# Altium footprint library myLib.PcbLib: 58 footprints (part 3 of 4)
Each footprint in its own frame and in the unit in brackets; x right, y up, seen from the top. Pads: shape width x height; smd on the part's side, far side on the other; paste and mask are expansions set on the pad; w line width, h text height; cw(c..) or ccw(c..) is an arc to the next point about the centre after c.
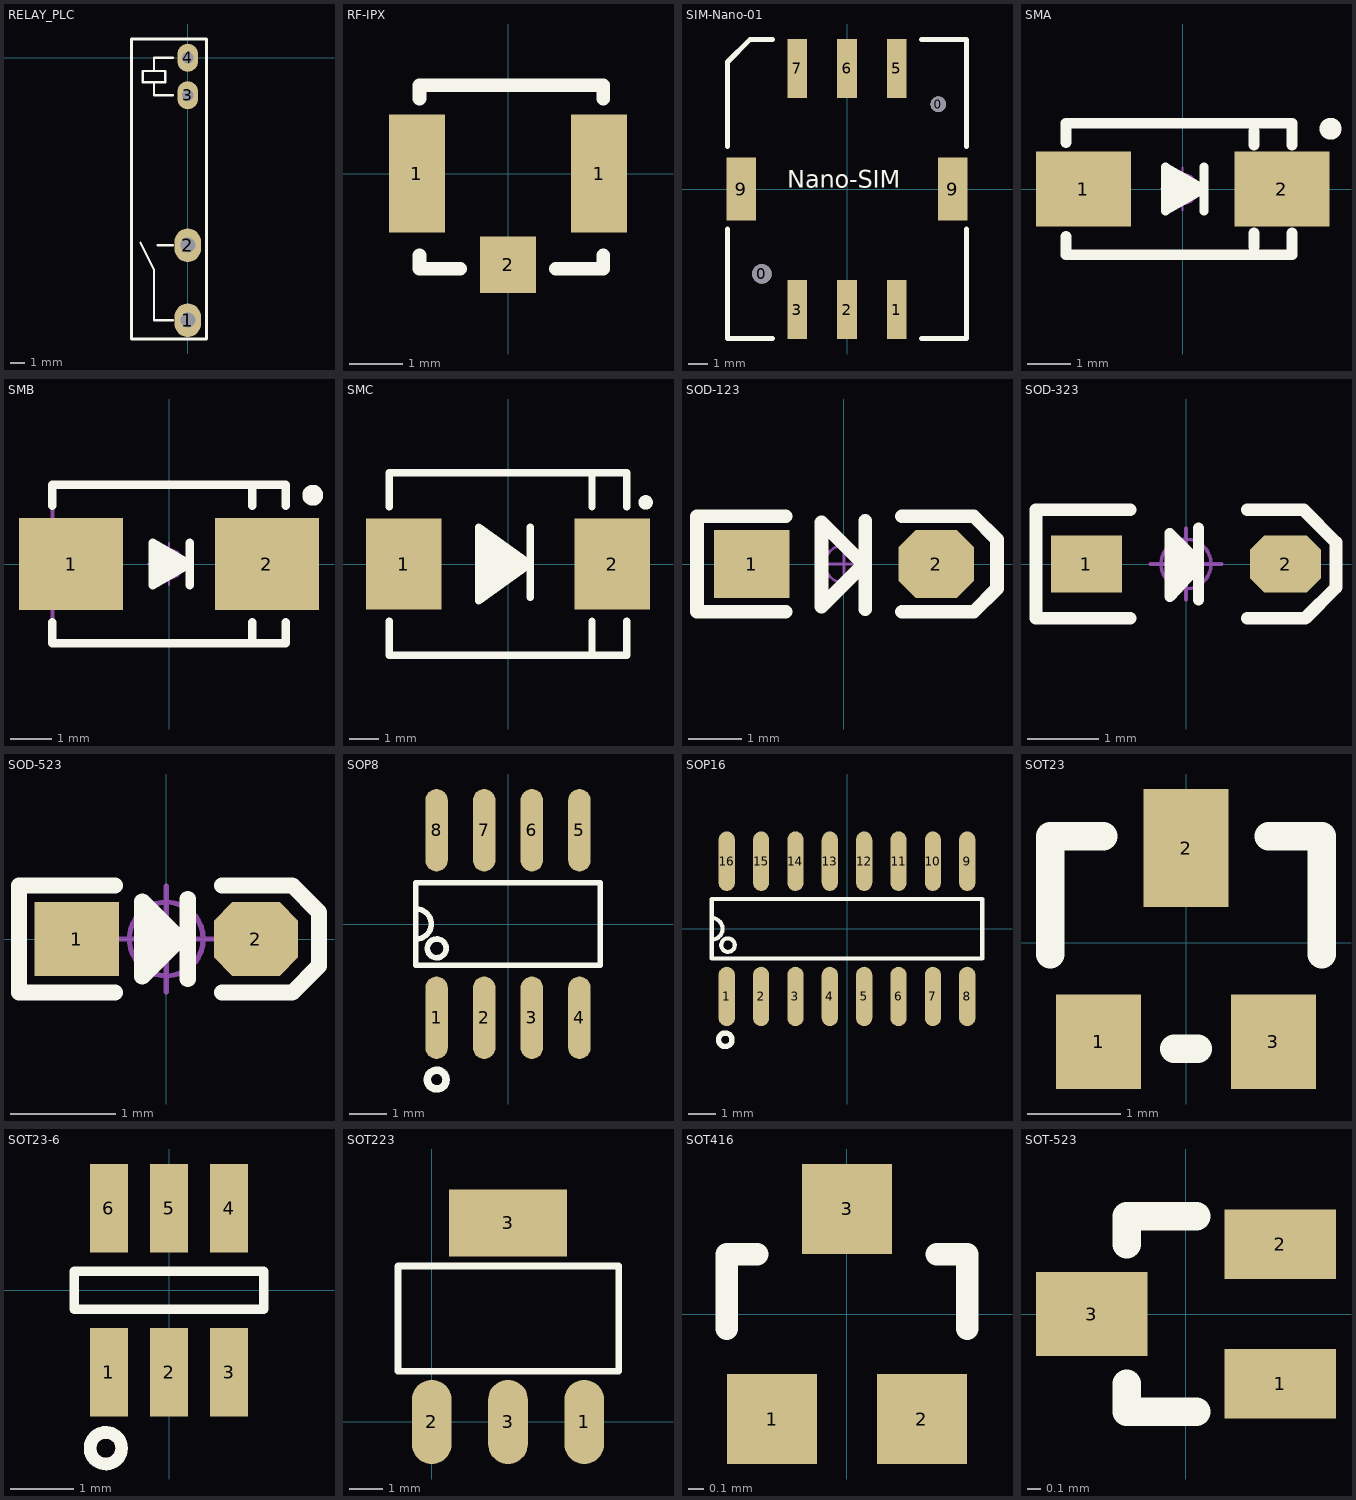
[diagram p2: the footprints below, top view; thin cyan lines are the x and y axes]

## RELAY_PLC [mil]
pads (4):
  oval 70x90 hole 40: 1(0,-700) 2(0,-500)
  oval 55x75 hole 30: 3(0,-100) 4(0,0)
Top Overlay:
  lines w6: -126,-493 -90,-565 -90,-700 -40,-700 ; -90,-65 -90,-100 -40,-100 ; -90,-35 -90,0 -40,0 ; -80,-500 -40,-500 ; -120,-65 -120,-35 -60,-35 -60,-65 -120,-65
  lines w8: -150,-750 50,-750 50,50 -150,50 -150,-750
3D body "RELAY_PLC.STEP": height 492.13, standoff -118.11, extent -148.43,-761.77 48.43,65

## RF-IPX [mm]
pads (3):
  rect 1.05x2.2 smd: 1(-1.7,0) 1(1.7,0)
  rect 1.05x1.05 smd: 2(0,-1.7)
Top Overlay:
  lines w0.254: -1.651,-1.524 -1.651,-1.778 -0.889,-1.778 ; -1.651,1.397 -1.651,1.651 1.778,1.651 1.778,1.397 ; 0.889,-1.778 1.778,-1.778 1.778,-1.524

## SIM-Nano-01 [mm]
pads (10):
  round 1 hole 1: 0(-4.34,-4.33)
  round 0.8 hole 0.8: 0(4.66,4.32)
  rect 1x3 smd: 1(2.54,-6.15) 2(0,-6.15) 3(-2.54,-6.15) 5(2.54,6.15) 6(0,6.15) 7(-2.54,6.15)
  rect 1.5x3.2 smd: 9(-5.4,0) 9(5.4,0)
Top Overlay:
  lines w0.254: -6.096,-2.032 -6.096,-7.62 -3.81,-7.62 ; -6.096,2.159 -6.096,6.477 -4.953,7.62 -3.81,7.62 ; 3.81,-7.62 6.096,-7.62 6.096,-2.032 ; 3.81,7.62 6.096,7.62 6.096,2.159
  text "Nano-SIM" at -3.048,-0.254 h1.52

## SMA [mm] "4.5x2.6*2.2mm（长宽高，不包括引脚）"
height 2.54
pads (2):
  rect 2.2x1.75 smd: 1(-2.3,0) 2(2.3,0)
Top Overlay:
  circle w0.254: c3.429,1.397 r0.127
  lines w0.203: 0.494,-0.508 0.494,0.508 ; -0.395,-0.508 -0.395,0.508 0.494,0 -0.395,-0.508
  lines w0.254: -2.7,-1.105 -2.7,-1.524 2.54,-1.524 2.54,-1.016 ; -2.7,1.08 -2.7,1.524 2.54,1.524 2.54,1.016 ; -0.33,0.305 0.305,0 -0.254,-0.305 -0.254,0.051 0.023,0 ; 1.651,-1.35 1.651,-1.016 ; 1.651,1.016 1.651,1.35
Mechanical 15:
  circle w0.05: c0,0 r0.35
  lines w0.05: -0.5,0 0.5,0 ; 0,-0.5 0,0.5
3D body "SMA.STEP": height 2.15, standoff 0.04, extent -2.528,-1.3 2.575,1.3

## SMB [mm] "4.7*3.9*2.2mm(长宽高，不包括引脚）"
height 2.4
pads (2):
  rect 2.5x2.2 smd: 1(-2.35,0) 2(2.35,0)
Top Overlay:
  circle w0.25: c3.45,1.65 r0.125
  lines w0.2: -2.8,-1.4 -2.8,-1.9 2.8,-1.9 2.8,-1.4 ; -2.8,1.4 -2.8,1.9 2.8,1.9 2.8,1.4 ; 2,-1.9 2,-1.4 ; 2,1.4 2,1.9
  lines w0.203: 0.5,-0.508 0.5,0.508 ; -0.389,-0.508 -0.389,0.508 0.5,0 -0.389,-0.508
  lines w0.254: -0.254,0 0.279,0 ; 0.279,0 -0.229,0.279 -0.229,-0.305 0.279,0
Mechanical 13:
  lines w0.1: 2.8,-1.9 -2.8,-1.9 -2.8,1.9 2.8,1.9
Mechanical 15:
  circle w0.05: c0,0 r0.35
  lines w0.05: -0.5,0 0.5,0 ; 0,-0.5 0,0.5
3D body "SMB.STEP": height 2.35, standoff 0.04, extent -2.629,-1.8 2.675,1.8

## SMC [mm] "7.1x5.9*2.3mm（长宽高，不包括引脚）"
height 2.41
pads (2):
  rect 2.6x3.15 smd: 1(-3.6,0) 2(3.6,0)
Top Overlay:
  circle w0.25: c4.75,2.125 r0.125
  lines w0.254: -4.1,-1.975 -4.1,-3.15 4.1,-3.15 4.1,-1.975 ; -4.1,1.975 -4.1,3.15 4.1,3.15 4.1,1.975 ; -0.889,0.991 0.5,0 -0.889,-0.965 -0.914,0.762 0.229,0 -0.711,-0.66 -0.762,0.483 0,-0.051 -0.584,-0.33 -0.635,0.152 -0.229,-0.051 -0.737,-0.127 ; 0.762,-1.143 0.762,1.27 ; 2.9,-3.15 2.9,-1.975 ; 2.9,1.975 2.9,3.15 ; -1.016,-1.27 0.762,0 -1.016,1.27 -1.016,-1.27
Mechanical 13:
  lines w0.1: -4.065,-3.11 4.065,-3.11 ; -4.065,3.11 4.065,3.11
Mechanical 15:
  circle w0.05: c0,0 r0.35
  lines w0.05: -0.5,0 0.5,0 ; 0,-0.5 0,0.5
3D body "SMC.STEP": height 2.45, standoff 0.03, extent -3.953,-2.9 3.953,2.9

## SOD-123 [mil] "2.7x1.6X1.1mm（长宽高，不包括引脚）"
pads (2):
  rect 55x50 smd: 1(-67.5,0)
  oct 55x50 smd: 2(67.5,0)
Top Overlay:
  lines w10: -42.5,-35 -107.5,-35 -107.5,35 -42.5,35 ; 14,-0.8 -16.4,-31.2 -16.4,30.5 15.6,-1.5 ; 15.6,-33.1 15.6,31.7 ; 42.5,-35 95,-35 112,-18 112,18 95,35 42.5,35
Mechanical 15:
  circle w1.97: c0,0 r13.78
  lines w1.97: -19.68,0 19.68,0 ; 0,-19.68 0,19.68
3D body "SOD-123.STEP": height 48.03, standoff 0, extent -72.84,-31.5 72.83,31.5

## SOD-323 [mm] "1.8x1.3X0.9mm（长宽高，不包括引脚）"
pads (2):
  rect 1x0.8 smd: 1(-1.4,0)
  oct 1x0.8 smd: 2(1.4,0)
Top Overlay:
  lines w0.152: 0.178,-0.508 0.178,0.508 ; 0.178,-0.025 -0.229,-0.457 -0.229,0.432 0.178,0.025
  lines w0.178: -0.787,-0.762 -2.108,-0.762 -2.108,0.762 -0.787,0.762 ; 0.864,-0.762 1.676,-0.762 2.108,-0.33 2.108,0.305 1.651,0.762 0.864,0.762
  lines w0.254: -0.127,0.254 -0.152,-0.178 0.025,-0.025 -0.025,0.127
Mechanical 15:
  circle w0.05: c0,0 r0.35
  lines w0.05: -0.5,0 0.5,0 ; 0,-0.5 0,0.5
3D body "SOD-323.STEP": height 1, standoff 0.04, extent -1.337,-0.631 1.311,0.669

## SOD-523 [mm] "1.2x0.8X0.6mm（长宽高，不包括引脚）"
pads (2):
  rect 0.8x0.7 smd: 1(-0.85,0)
  oct 0.8x0.7 smd: 2(0.85,0)
Top Overlay:
  rectangle: -0.178,-0.178 0,0.178
  lines w0.152: -0.488,-0.508 -1.397,-0.508 -1.397,0.508 -0.488,0.508 ; -0.127,0 0.127,0 ; 0.203,-0.381 0.203,0.381 ; 0.528,-0.508 1.194,-0.508 1.448,-0.254 1.448,0.254 1.194,0.508 0.528,0.508 ; 0.127,0 -0.229,-0.356 -0.229,0.356 0.127,0
Mechanical 15:
  circle w0.05: c0,0 r0.35
  lines w0.05: -0.5,0 0.5,0 ; 0,-0.5 0,0.5
3D body "SOD-523.STEP": height 0.65, standoff 0.05, extent -0.8,-0.4 0.8,0.4

## SOP8 [mm]
pads (8):
  oval 0.6x2.2 smd: 1(-1.905,-2.5) 2(-0.635,-2.5) 3(0.635,-2.5) 4(1.905,-2.5) 5(1.905,2.5) 6(0.635,2.5) 7(-0.635,2.5) 8(-1.905,2.5)
Top Overlay:
  circle w0.15: c-1.9,-0.65 r0.25
  circle w0.2: c-1.9,-4.15 r0.25
  lines w0.15: -2.447,-0.4 ccw(c-2.447,0) -2.447,0.4 ; -2.46,-1.1 -2.46,1.1 2.46,1.1 2.46,-1.1 -2.46,-1.1

## SOP16 [mm]
pads (16):
  oval 0.6x2.2 smd: 1(-4.445,-2.5) 2(-3.175,-2.5) 3(-1.905,-2.5) 4(-0.635,-2.5) 5(0.635,-2.5) 6(1.905,-2.5) 7(3.175,-2.5) 8(4.445,-2.5) 9(4.445,2.5) 10(3.175,2.5) 11(1.905,2.5) 12(0.635,2.5) 13(-0.635,2.5) 14(-1.905,2.5) 15(-3.175,2.5) 16(-4.445,2.5)
Top Overlay:
  circle w0.15: c-4.4,-0.6 r0.25
  circle w0.2: c-4.5,-4.1 r0.25
  lines w0.15: -5,-0.4 ccw(c-5,0) -5,0.4 ; -5,-1.1 -5,1.1 5,1.1 5,-1.1 -5,-1.1
3D body "User Library-SOP16.STEP": height 1.59, standoff 0, extent -4.99,-3.117 4.991,3.118

## SOT23 [mil]
pads (3):
  rect 36x40 smd: 1(-37,-42) 3(37,-42)
  rect 36x50 smd: 2(0,40)
Top Overlay:
  lines w12: -57.5,-5 -57.5,45 -35,45 ; -5,-45 5,-45 ; 35,45 57.5,45 57.5,-5
3D body "SOT23.STEP": height 39.37, standoff -1.97, extent -57.09,-47.24 57.09,51.18

## SOT23-6 [mm]
pads (6):
  rect 0.6x1.4 smd: 1(-0.95,-1.3) 2(0,-1.3) 3(0.95,-1.3) 4(0.95,1.3) 5(0,1.3) 6(-0.95,1.3)
Top Overlay:
  circle w0.2: c-1,-2.5 r0.25
  lines w0.15: -1.5,-0.3 1.5,-0.3 1.5,0.3 -1.5,0.3 -1.5,-0.3
3D body "User Library-SOT23-6-1.STEP": height 1.09, standoff 0, extent -1.397,-1.126 1.397,1.3

## SOT223 [mm]
pads (4):
  oval 1.2x2.54 smd: 1(4.6,0) 2(0,0) 3(2.3,0)
  rect 3.556x2.032 smd: 3(2.3,6)
Top Overlay:
  lines w0.203: -1.016,1.524 5.639,1.524 5.639,4.699 -1.016,4.699 -1.016,1.524
3D body "SOT223.STEP": height 1.6, standoff -0.15, extent -0.839,-0.508 5.461,6.392

## SOT416 [mm]
pads (3):
  rect 0.6x0.6 smd: 1(-0.5,-0.7) 2(0.5,-0.7) 3(0,0.7)
Top Overlay:
  lines w0.15: -0.8,-0.1 -0.8,0.4 -0.6,0.4 ; 0.6,0.4 0.8,0.4 0.8,-0.1

## SOT-523 [mm]
pads (3):
  rect 0.8x0.5 smd: 1(0.675,-0.5) 2(0.675,0.5)
  rect 0.8x0.6 smd: 3(-0.675,0)
Top Overlay:
  lines w0.203: -0.425,-0.5 -0.425,-0.7 0.075,-0.7 ; -0.425,0.5 -0.425,0.7 0.075,0.7
3D body "User Library-SOT-523.STEP": height 0.8, standoff 0, extent -0.825,-0.8 0.775,0.8